# Altium footprint library MH_DA_THU_VIEN_16122016.PcbLib: 531 footprints (part 9 of 34)
Each footprint in its own frame and in the unit in brackets; x right, y up, seen from the top. Pads: shape width x height; smd on the part's side, far side on the other; paste and mask are expansions set on the pad; w line width, h text height; cw(c..) or ccw(c..) is an arc to the next point about the centre after c.
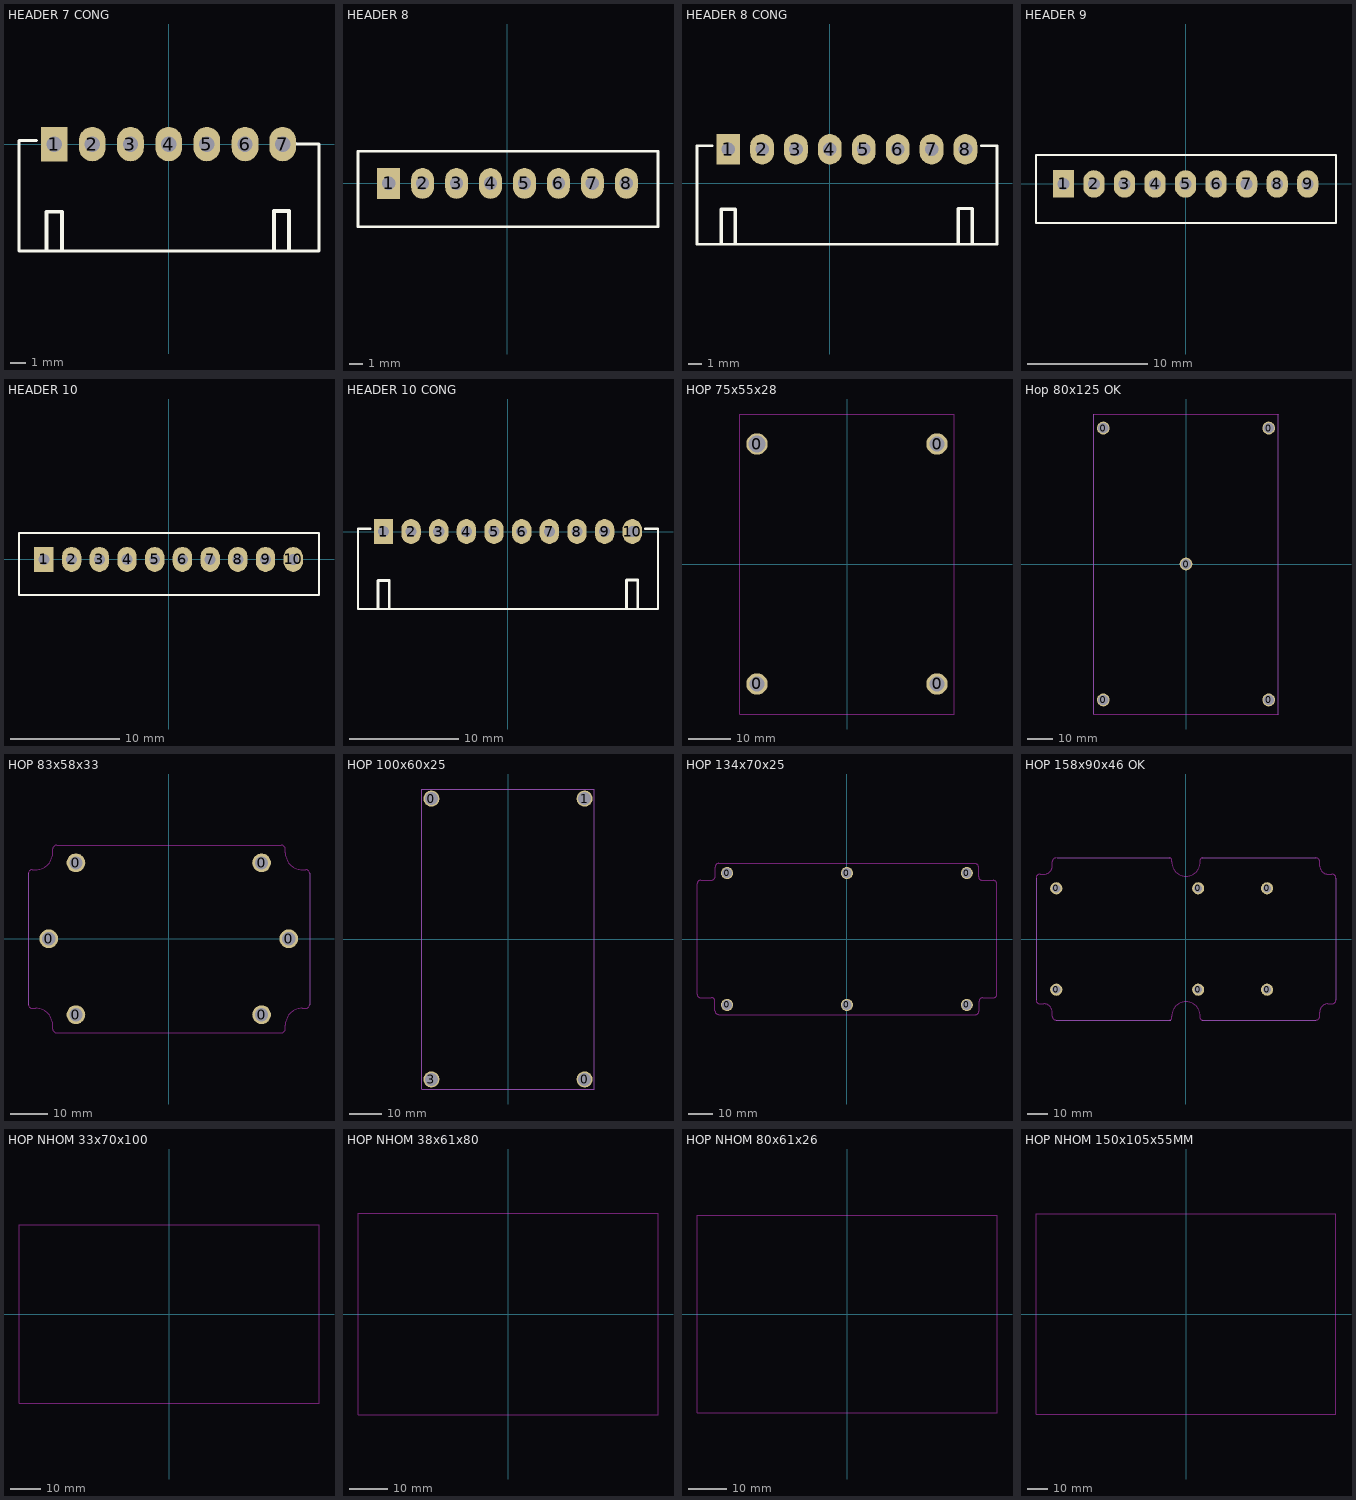
[diagram p8: the footprints below, top view; thin cyan lines are the x and y axes]

## HEADER 7 CONG [mil]
pads (7):
  rect 70x90 hole 40 unplated: 1(-300,0)
  oval 70x90 hole 40 unplated: 2(-200,0) 3(-100,0) 4(0,0) 5(100,0) 6(200,0) 7(298.43,0)
Top Overlay:
  lines w7.87: -346.65,10 -392,10 -392,-280 393.7,-280 393.7,0 334.02,0 324.02,10
  lines w10: -320,-276 -320,-177 -279,-177 -279,-279 ; 275.59,-279 275.59,-175 314.96,-175 314.96,-279

## HEADER 8 [mm]
pads (8):
  rect 1.7x2.3 hole 1 paste+0: 1(-8.89,0)
  oval 1.7x2.3 hole 1 paste+0: 2(-6.35,0) 3(-3.81,0) 4(-1.27,0) 5(1.27,0) 6(3.81,0) 7(6.35,0) 8(8.89,0)
Top Overlay:
  lines w0.2: -11.176,-3.251 -11.176,2.413 11.252,2.413 11.252,-3.251 -11.176,-3.251

## HEADER 8 CONG [mil]
pads (8):
  rect 70x90 hole 40 unplated: 1(-300,100)
  oval 70x90 hole 40 unplated: 2(-200,100) 3(-100,100) 4(0,100) 5(100,100) 6(200,100) 7(300,100) 8(400,100)
Top Overlay:
  lines w7.87: -346.65,110 -392,110 -392,-180 493,-180 493,110 446.65,110
  lines w10: -320,-176 -320,-77 -279,-77 -279,-179 ; 379,-179 379,-75 420,-75 420,-179

## HEADER 9 [mil]
pads (9):
  rect 70x90 hole 39.37 unplated: 1(-400,0)
  oval 70x90 hole 39.37 unplated: 2(-300,0) 3(-200,0) 4(-100,0) 5(0,0) 6(100,0) 7(200,0) 8(300,0) 9(400,0)
Top Overlay:
  lines w7.87: -490,-128 -490,95 493,95 493,-128 -490,-128

## HEADER 10 [mil]
pads (10):
  rect 70x90 hole 39.37 unplated: 1(-450,0)
  oval 70x90 hole 39.37 unplated: 2(-350,0) 3(-250,0) 4(-150,0) 5(-50,0) 6(50,0) 7(150,0) 8(250,0) 9(350,0) 10(450,0)
Top Overlay:
  lines w7.87: -540,-128 543,-128 543,95 -540,95 -540,-128

## HEADER 10 CONG [mil]
pads (10):
  rect 70x90 hole 40 unplated: 1(-450,0)
  oval 70x90 hole 40 unplated: 2(-350,0) 3(-250,0) 4(-150,0) 5(-50,0) 6(50,0) 7(150,0) 8(250,0) 9(350,0) 10(450,0)
Top Overlay:
  lines w7.87: -496.65,10 -542,10 -542,-280 543,-280 543,10 496.65,10
  lines w10: -470,-276 -470,-177 -429,-177 -429,-279 ; 429,-279 429,-175 470,-175 470,-279

## HOP 75x55x28 [mm]
pads (4):
  round 5 hole 3.5: 0(-21,-28) 0(21,-28) 0(21,28)
  round 5 hole 4: 0(-21,28)
Keep-Out Layer:
  lines w0.254: -25,-35 -25,35 25,35 25,-35 -25,-35

## Hop 80x125 OK [mm]
pads (5):
  round 5 hole 4: 0(-32.25,-53) 0(-32.25,53) 0(0,0) 0(32.25,-53) 0(32.25,53)
Keep-Out Layer:
  lines w0.254: -36,-58.5 36,-58.5 ; -36,58.5 36,58.5
Mechanical 1:
  lines w0.254: -36,-58.5 -36,58.5 ; 36,-58.5 36,58.5

## HOP 83x58x33 [mm]
pads (6):
  round 5 hole 3.5: 0(-32,0) 0(-24.75,-20.25) 0(-24.75,20.25) 0(24.75,-20.25) 0(24.75,20.25) 0(32,0)
Keep-Out Layer:
  lines w0.254: -37.435,-17.554 ccw(c-36.435,-17.554) -36.435,-18.554 -35.435,-18.554 cw(c-35.435,-23.054) -30.935,-23.054 -30.935,-24.054 ccw(c-29.935,-24.054) -29.935,-25.054 ; -37.435,17.446 cw(c-36.435,17.446) -36.435,18.446 -35.435,18.446 ccw(c-35.435,22.946) -30.935,22.946 -30.935,23.946 cw(c-29.935,23.946) -29.935,24.946 30,25 ; -30,-25 30,-25 ; 30.065,-25.054 ccw(c30.065,-24.054) 31.065,-24.054 31.065,-23.054 cw(c35.565,-23.054) 35.565,-18.554 36.565,-18.554 ccw(c36.565,-17.554) 37.565,-17.554 ; 30.065,24.946 cw(c30.065,23.946) 31.065,23.946 31.065,22.946 ccw(c35.565,22.946) 35.565,18.446 36.565,18.446 cw(c36.565,17.446) 37.565,17.446
Mechanical 1:
  lines w0.254: -37.435,-17.554 -37.435,17.446 ; 37.565,-17.554 37.565,17.446

## HOP 100x60x25 [mm]
pads (4):
  round 5 hole 4: 0(-24,44) 0(24,-44) 1(24,44) 3(-24,-44)
Mechanical 1:
  lines w0.254: -27,-47 -27,47 27,47 27,-47 -27,-47

## HOP 134x70x25 [mm]
pads (6):
  round 5 hole 4: 0(-50,-27.5) 0(-50,27.5) 0(0,-27.5) 0(0,27.5) 0(50,-27.5) 0(50,27.5)
Keep-Out Layer:
  lines w0.254: -62.52,-22.97 ccw(c-61.02,-22.97) -61.02,-24.47 -56.52,-24.47 cw(c-56.52,-25.97) -55.02,-25.97 -55.02,-29.97 ccw(c-53.52,-29.97) -53.52,-31.47 ; -62.5,-23 -62.5,23 cw(c-61,23) -61,24.5 -56.5,24.5 ccw(c-56.5,26) -55,26 -55,30 cw(c-53.5,30) -53.5,31.5 54,31.5 ; -53.35,-31.5 54,-31.5 ; 53.48,31.42 cw(c53.43,29.97) 54.88,29.92 54.88,25.92 ccw(c56.43,25.97) 56.48,24.42 60.98,24.42 cw(c60.98,22.92) 62.48,22.92 ; 53.56,-31.5 ccw(c53.56,-30) 55.06,-30 55.06,-26 cw(c56.56,-26) 56.56,-24.5 61.06,-24.5 ccw(c61.06,-23) 62.56,-23 ; 62.5,-23.01 62.51,23.16

## HOP 158x90x46 OK [mm]
pads (6):
  round 6 hole 4: 0(-64,-25) 0(-64,25) 0(6,-25) 0(6,25) 0(40,-25) 0(40,25)
Keep-Out Layer:
  lines w0.254: -74,-30 ccw(c-72,-30) -72,-32 -70.176,-32.004 cw(c-70,-36) -66,-36 -66,-38 ccw(c-64,-38) -64,-40 ; -74,30 cw(c-72,30) -72,32 -70,32 ccw(c-70,36) -66.004,36.176 -66,38 cw(c-64,38) -64,40 ; -8,-40 ccw(c-8,-39) -7,-39 -7,-38 cw(c0,-38) 7,-38 7,-39 ccw(c8,-39) 8,-40 ; -8,40 cw(c-8,39) -7,39 -7,38 ccw(c0,38) 7,38 7,39 cw(c8,39) 8,40 ; 64,-40 ccw(c64,-38) 66,-38 66.004,-36.176 cw(c70,-36) 70,-32 72,-32 ccw(c72,-30) 74,-30 ; 64,40 cw(c64,38) 66,38 66,36 ccw(c70,36) 70.176,32.004 72,32 cw(c72,30) 74,30
Mechanical 1:
  lines w0.254: -74,-30 -74,30 ; -64,-40 -7.5,-40 ; -63.5,40 -8,40 ; 8,-40 64,-40 ; 8,40 64,40 ; 74,-30 74,30

## HOP NHOM 33x70x100 [mm]
Keep-Out Layer:
  lines w0.254: -49.5,-29.5 -49.5,29.5 49.5,29.5 49.5,-29.5 -49.5,-29.5

## HOP NHOM 38x61x80 [mm]
Keep-Out Layer:
  lines w0.254: -39.5,-26.5 -39.5,26.5 39.5,26.5 39.5,-26.5 -39.5,-26.5

## HOP NHOM 80x61x26 [mm]
Keep-Out Layer:
  lines w0.254: -39.5,-26 39.5,-26 39.5,26 -39.5,26 -39.5,-26

## HOP NHOM 150x105x55MM [mm]
Keep-Out Layer:
  lines w0.254: -74,-49.5 -74,49.5 74,49.5 74,-49.5 -74,-49.5